# Altium schematic symbol library jlcpcb_2025_04_resistors_extended_0201.schlib: 1508 symbols (part 7 of 8) (continued)
## RTT01435JTH
designator R?  Resistance: 4.3MΩ  (hidden comment: *)
Resistor, 4.3MΩ, ±5%, 50mW, 25V, ±200ppm/℃, -55℃~+125℃, SMD 0201; Manufacturer: Uniroyal; Manufacturer Part Number: RTT01435JTH; Supplier 1: LCSC; Supplier Part Number 1: C166401; JLCPCB Part Number: C166401; Power Rating: 50mW; Category: Resistors; Package Size: 0201; JLCPCB Basic Part: Yes; Tolerance: ±5%; Voltage Rating: 25V; Temperature Coefficient: ±200ppm/℃; Temperature Rating: -55℃~+125℃; ComponentLink1Description: Datasheet; ComponentLink1URL: https://wmsc.lcsc.com/wmsc/upload/file/pdf/v2/lcsc/2304140030_RALEC-RTT01435JTH_C166401.pdf; ComponentLink2Description: JLCPCB Part URL; ComponentLink2URL: https://jlcpcb.com/partdetail/C166401
pins: 1, 2
1 alternate drawing of the same symbol

## RTT01510JTH
designator R?  Resistance: 51Ω  (hidden comment: *)
Resistor, 51Ω, ±5%, 50mW, 25V, ±200ppm/℃, -55℃~+125℃, SMD 0201; Manufacturer: Uniroyal; Manufacturer Part Number: RTT01510JTH; Supplier 1: LCSC; Supplier Part Number 1: C102735; JLCPCB Part Number: C102735; Power Rating: 50mW; Category: Resistors; Package Size: 0201; JLCPCB Basic Part: Yes; Tolerance: ±5%; Voltage Rating: 25V; Temperature Coefficient: ±200ppm/℃; Temperature Rating: -55℃~+125℃; ComponentLink1Description: Datasheet; ComponentLink1URL: https://wmsc.lcsc.com/wmsc/upload/file/pdf/v2/lcsc/2304140030_RALEC-RTT01510JTH_C102735.pdf; ComponentLink2Description: JLCPCB Part URL; ComponentLink2URL: https://jlcpcb.com/partdetail/C102735
pins: 1, 2
1 alternate drawing of the same symbol

## RTT01512JTH
designator R?  Resistance: 5.1kΩ  (hidden comment: *)
Resistor, 5.1kΩ, ±5%, 50mW, ±200ppm/℃, SMD 0201; Manufacturer: Uniroyal; Manufacturer Part Number: RTT01512JTH; Supplier 1: LCSC; Supplier Part Number 1: C158467; JLCPCB Part Number: C158467; Power Rating: 50mW; Category: Resistors; Package Size: 0201; JLCPCB Basic Part: Yes; Tolerance: ±5%; Temperature Coefficient: ±200ppm/℃; ComponentLink1Description: Datasheet; ComponentLink1URL: https://wmsc.lcsc.com/wmsc/upload/file/pdf/v2/lcsc/2304140030_RALEC-RTT01512JTH_C158467.pdf; ComponentLink2Description: JLCPCB Part URL; ComponentLink2URL: https://jlcpcb.com/partdetail/C158467
pins: 1, 2
1 alternate drawing of the same symbol

## RTT01513JTH
designator R?  Resistance: 51kΩ  (hidden comment: *)
Resistor, 51kΩ, ±5%, 50mW, ±200ppm/℃, SMD 0201; Manufacturer: Uniroyal; Manufacturer Part Number: RTT01513JTH; Supplier 1: LCSC; Supplier Part Number 1: C102736; JLCPCB Part Number: C102736; Power Rating: 50mW; Category: Resistors; Package Size: 0201; JLCPCB Basic Part: Yes; Tolerance: ±5%; Temperature Coefficient: ±200ppm/℃; ComponentLink1Description: Datasheet; ComponentLink1URL: https://wmsc.lcsc.com/wmsc/upload/file/pdf/v2/lcsc/2304140030_RALEC-RTT01513JTH_C102736.pdf; ComponentLink2Description: JLCPCB Part URL; ComponentLink2URL: https://jlcpcb.com/partdetail/C102736
pins: 1, 2
1 alternate drawing of the same symbol

## RTT01620JTH
designator R?  Resistance: 62Ω  (hidden comment: *)
Resistor, 62Ω, ±5%, 50mW, 25V, ±200ppm/℃, -55℃~+125℃, SMD 0201; Manufacturer: Uniroyal; Manufacturer Part Number: RTT01620JTH; Supplier 1: LCSC; Supplier Part Number 1: C166397; JLCPCB Part Number: C166397; Power Rating: 50mW; Category: Resistors; Package Size: 0201; JLCPCB Basic Part: Yes; Tolerance: ±5%; Voltage Rating: 25V; Temperature Coefficient: ±200ppm/℃; Temperature Rating: -55℃~+125℃; ComponentLink1Description: Datasheet; ComponentLink1URL: https://wmsc.lcsc.com/wmsc/upload/file/pdf/v2/lcsc/2304140030_RALEC-RTT01620JTH_C166397.pdf; ComponentLink2Description: JLCPCB Part URL; ComponentLink2URL: https://jlcpcb.com/partdetail/C166397
pins: 1, 2
1 alternate drawing of the same symbol

## RTT01680JTH
designator R?  Resistance: 68Ω  (hidden comment: *)
Resistor, 68Ω, ±5%, 50mW, 25V, ±200ppm/℃, -55℃~+125℃, SMD 0201; Manufacturer: Uniroyal; Manufacturer Part Number: RTT01680JTH; Supplier 1: LCSC; Supplier Part Number 1: C158386; JLCPCB Part Number: C158386; Power Rating: 50mW; Category: Resistors; Package Size: 0201; JLCPCB Basic Part: Yes; Tolerance: ±5%; Voltage Rating: 25V; Temperature Coefficient: ±200ppm/℃; Temperature Rating: -55℃~+125℃; ComponentLink1Description: Datasheet; ComponentLink1URL: https://wmsc.lcsc.com/wmsc/upload/file/pdf/v2/lcsc/2304140030_RALEC-RTT01680JTH_C158386.pdf; ComponentLink2Description: JLCPCB Part URL; ComponentLink2URL: https://jlcpcb.com/partdetail/C158386
pins: 1, 2
1 alternate drawing of the same symbol

## RTT01681JTH
designator R?  Resistance: 680Ω  (hidden comment: *)
Resistor, 680Ω, ±5%, 50mW, ±200ppm/℃, SMD 0201; Manufacturer: Uniroyal; Manufacturer Part Number: RTT01681JTH; Supplier 1: LCSC; Supplier Part Number 1: C158380; JLCPCB Part Number: C158380; Power Rating: 50mW; Category: Resistors; Package Size: 0201; JLCPCB Basic Part: Yes; Tolerance: ±5%; Temperature Coefficient: ±200ppm/℃; ComponentLink1Description: Datasheet; ComponentLink1URL: https://wmsc.lcsc.com/wmsc/upload/file/pdf/v2/lcsc/2304140030_RALEC-RTT01681JTH_C158380.pdf; ComponentLink2Description: JLCPCB Part URL; ComponentLink2URL: https://jlcpcb.com/partdetail/C158380
pins: 1, 2
1 alternate drawing of the same symbol

## RTT01683JTH
designator R?  Resistance: 68kΩ  (hidden comment: *)
Resistor, 68kΩ, ±5%, 50mW, 25V, ±200ppm/℃, -55℃~+125℃, SMD 0201; Manufacturer: Uniroyal; Manufacturer Part Number: RTT01683JTH; Supplier 1: LCSC; Supplier Part Number 1: C158378; JLCPCB Part Number: C158378; Power Rating: 50mW; Category: Resistors; Package Size: 0201; JLCPCB Basic Part: Yes; Tolerance: ±5%; Voltage Rating: 25V; Temperature Coefficient: ±200ppm/℃; Temperature Rating: -55℃~+125℃; ComponentLink1Description: Datasheet; ComponentLink1URL: https://wmsc.lcsc.com/wmsc/upload/file/pdf/v2/lcsc/2304140030_RALEC-RTT01683JTH_C158378.pdf; ComponentLink2Description: JLCPCB Part URL; ComponentLink2URL: https://jlcpcb.com/partdetail/C158378
pins: 1, 2
1 alternate drawing of the same symbol

## RTT01685JTH
designator R?  Resistance: 6.8MΩ  (hidden comment: *)
Resistor, 6.8MΩ, ±5%, 50mW, ±200ppm/℃, SMD 0201; Manufacturer: Uniroyal; Manufacturer Part Number: RTT01685JTH; Supplier 1: LCSC; Supplier Part Number 1: C158374; JLCPCB Part Number: C158374; Power Rating: 50mW; Category: Resistors; Package Size: 0201; JLCPCB Basic Part: Yes; Tolerance: ±5%; Temperature Coefficient: ±200ppm/℃; ComponentLink1Description: Datasheet; ComponentLink1URL: https://wmsc.lcsc.com/wmsc/upload/file/pdf/v2/lcsc/2304140030_RALEC-RTT01685JTH_C158374.pdf; ComponentLink2Description: JLCPCB Part URL; ComponentLink2URL: https://jlcpcb.com/partdetail/C158374
pins: 1, 2
1 alternate drawing of the same symbol

## RTT01754JTH
designator R?  Resistance: 750kΩ  (hidden comment: *)
Resistor, 750kΩ, ±5%, 50mW, 25V, ±200ppm/℃, -55℃~+125℃, SMD 0201; Manufacturer: Uniroyal; Manufacturer Part Number: RTT01754JTH; Supplier 1: LCSC; Supplier Part Number 1: C158350; JLCPCB Part Number: C158350; Power Rating: 50mW; Category: Resistors; Package Size: 0201; JLCPCB Basic Part: Yes; Tolerance: ±5%; Voltage Rating: 25V; Temperature Coefficient: ±200ppm/℃; Temperature Rating: -55℃~+125℃; ComponentLink1Description: Datasheet; ComponentLink1URL: https://wmsc.lcsc.com/wmsc/upload/file/pdf/v2/lcsc/2304140030_RALEC-RTT01754JTH_C158350.pdf; ComponentLink2Description: JLCPCB Part URL; ComponentLink2URL: https://jlcpcb.com/partdetail/C158350
pins: 1, 2
1 alternate drawing of the same symbol

## RTT01823JTH
designator R?  Resistance: 82kΩ  (hidden comment: *)
Resistor, 82kΩ, ±5%, 50mW, 25V, ±200ppm/℃, -55℃~+125℃, SMD 0201; Manufacturer: Uniroyal; Manufacturer Part Number: RTT01823JTH; Supplier 1: LCSC; Supplier Part Number 1: C166392; JLCPCB Part Number: C166392; Power Rating: 50mW; Category: Resistors; Package Size: 0201; JLCPCB Basic Part: Yes; Tolerance: ±5%; Voltage Rating: 25V; Temperature Coefficient: ±200ppm/℃; Temperature Rating: -55℃~+125℃; ComponentLink1Description: Datasheet; ComponentLink1URL: https://wmsc.lcsc.com/wmsc/upload/file/pdf/v2/lcsc/2304140030_RALEC-RTT01823JTH_C166392.pdf; ComponentLink2Description: JLCPCB Part URL; ComponentLink2URL: https://jlcpcb.com/partdetail/C166392
pins: 1, 2
1 alternate drawing of the same symbol

## RTT011001FTH
designator R?  Resistance: 1kΩ  (hidden comment: *)
Resistor, 1kΩ, ±1%, 50mW, 25V, ±200ppm/℃, -55℃~+125℃, SMD 0201; Manufacturer: Uniroyal; Manufacturer Part Number: RTT011001FTH; Supplier 1: LCSC; Supplier Part Number 1: C102683; JLCPCB Part Number: C102683; Power Rating: 50mW; Category: Resistors; Package Size: 0201; JLCPCB Basic Part: Yes; Tolerance: ±1%; Voltage Rating: 25V; Temperature Coefficient: ±200ppm/℃; Temperature Rating: -55℃~+125℃; ComponentLink1Description: Datasheet; ComponentLink1URL: https://wmsc.lcsc.com/wmsc/upload/file/pdf/v2/lcsc/2304140030_RALEC-RTT011001FTH_C102683.pdf; ComponentLink2Description: JLCPCB Part URL; ComponentLink2URL: https://jlcpcb.com/partdetail/C102683
pins: 1, 2
1 alternate drawing of the same symbol

## RTT011002FTH
designator R?  Resistance: 10kΩ  (hidden comment: *)
Resistor, 10kΩ, ±1%, 50mW, 25V, ±200ppm/℃, -55℃~+125℃, SMD 0201; Manufacturer: Uniroyal; Manufacturer Part Number: RTT011002FTH; Supplier 1: LCSC; Supplier Part Number 1: C102684; JLCPCB Part Number: C102684; Power Rating: 50mW; Category: Resistors; Package Size: 0201; JLCPCB Basic Part: Yes; Tolerance: ±1%; Voltage Rating: 25V; Temperature Coefficient: ±200ppm/℃; Temperature Rating: -55℃~+125℃; ComponentLink1Description: Datasheet; ComponentLink1URL: https://wmsc.lcsc.com/wmsc/upload/file/pdf/v2/lcsc/2304140030_RALEC-RTT011002FTH_C102684.pdf; ComponentLink2Description: JLCPCB Part URL; ComponentLink2URL: https://jlcpcb.com/partdetail/C102684
pins: 1, 2
1 alternate drawing of the same symbol

## RTT011003FTH
designator R?  Resistance: 100kΩ  (hidden comment: *)
Resistor, 100kΩ, ±1%, 50mW, 25V, ±200ppm/℃, -55℃~+125℃, SMD 0201; Manufacturer: Uniroyal; Manufacturer Part Number: RTT011003FTH; Supplier 1: LCSC; Supplier Part Number 1: C102685; JLCPCB Part Number: C102685; Power Rating: 50mW; Category: Resistors; Package Size: 0201; JLCPCB Basic Part: Yes; Tolerance: ±1%; Voltage Rating: 25V; Temperature Coefficient: ±200ppm/℃; Temperature Rating: -55℃~+125℃; ComponentLink1Description: Datasheet; ComponentLink1URL: https://wmsc.lcsc.com/wmsc/upload/file/pdf/v2/lcsc/2304140030_RALEC-RTT011003FTH_C102685.pdf; ComponentLink2Description: JLCPCB Part URL; ComponentLink2URL: https://jlcpcb.com/partdetail/C102685
pins: 1, 2
1 alternate drawing of the same symbol

## RTT011004FTH
designator R?  Resistance: 1MΩ  (hidden comment: *)
Resistor, 1MΩ, ±1%, 50mW, 25V, ±200ppm/℃, -55℃~+125℃, SMD 0201; Manufacturer: Uniroyal; Manufacturer Part Number: RTT011004FTH; Supplier 1: LCSC; Supplier Part Number 1: C102686; JLCPCB Part Number: C102686; Power Rating: 50mW; Category: Resistors; Package Size: 0201; JLCPCB Basic Part: Yes; Tolerance: ±1%; Voltage Rating: 25V; Temperature Coefficient: ±200ppm/℃; Temperature Rating: -55℃~+125℃; ComponentLink1Description: Datasheet; ComponentLink1URL: https://wmsc.lcsc.com/wmsc/upload/file/pdf/v2/lcsc/2304140030_RALEC-RTT011004FTH_C102686.pdf; ComponentLink2Description: JLCPCB Part URL; ComponentLink2URL: https://jlcpcb.com/partdetail/C102686
pins: 1, 2
1 alternate drawing of the same symbol

## RTT011050FTH
designator R?  Resistance: 105Ω  (hidden comment: *)
Resistor, 105Ω, ±1%, 50mW, ±200ppm/℃, SMD 0201; Manufacturer: Uniroyal; Manufacturer Part Number: RTT011050FTH; Supplier 1: LCSC; Supplier Part Number 1: C158870; JLCPCB Part Number: C158870; Power Rating: 50mW; Category: Resistors; Package Size: 0201; JLCPCB Basic Part: Yes; Tolerance: ±1%; Temperature Coefficient: ±200ppm/℃; ComponentLink1Description: Datasheet; ComponentLink1URL: https://wmsc.lcsc.com/wmsc/upload/file/pdf/v2/lcsc/2304140030_RALEC-RTT011050FTH_C158870.pdf; ComponentLink2Description: JLCPCB Part URL; ComponentLink2URL: https://jlcpcb.com/partdetail/C158870
pins: 1, 2
1 alternate drawing of the same symbol

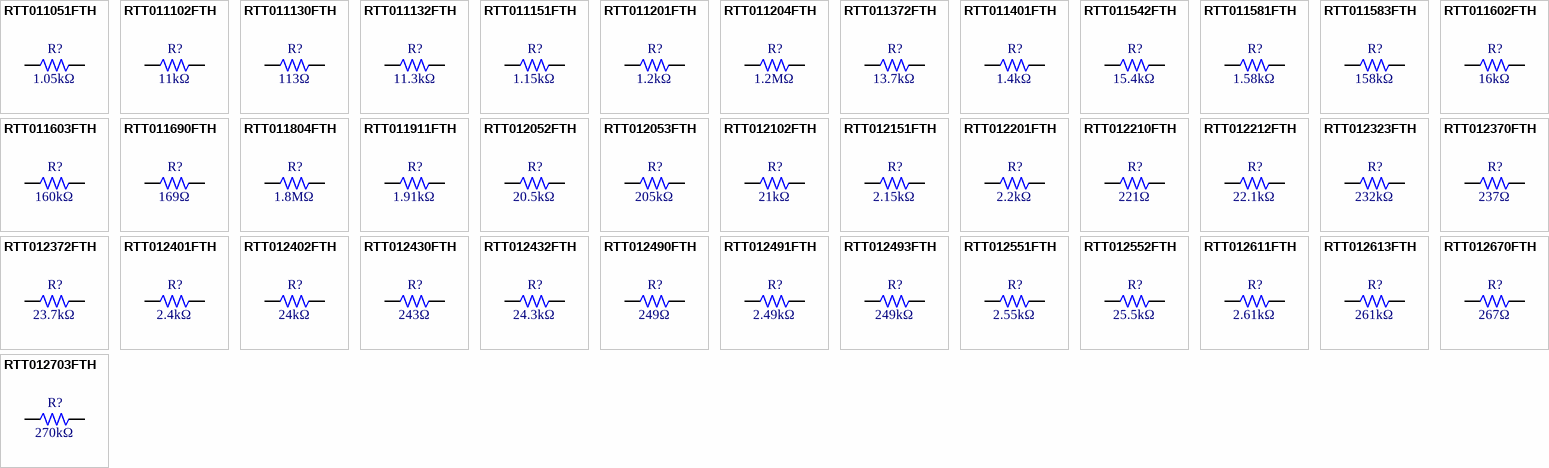
[diagram p31: symbols RTT011051FTH to RTT012703FTH]

## RTT011051FTH
designator R?  Resistance: 1.05kΩ  (hidden comment: *)
Resistor, 1.05kΩ, ±1%, 50mW, 25V, ±200ppm/℃, -55℃~+125℃, SMD 0201; Manufacturer: Uniroyal; Manufacturer Part Number: RTT011051FTH; Supplier 1: LCSC; Supplier Part Number 1: C332422; JLCPCB Part Number: C332422; Power Rating: 50mW; Category: Resistors; Package Size: 0201; JLCPCB Basic Part: Yes; Tolerance: ±1%; Voltage Rating: 25V; Temperature Coefficient: ±200ppm/℃; Temperature Rating: -55℃~+125℃; ComponentLink1Description: Datasheet; ComponentLink1URL: https://wmsc.lcsc.com/wmsc/upload/file/pdf/v2/lcsc/2304140030_RALEC-RTT011051FTH_C332422.pdf; ComponentLink2Description: JLCPCB Part URL; ComponentLink2URL: https://jlcpcb.com/partdetail/C332422
pins: 1, 2
1 alternate drawing of the same symbol

## RTT011102FTH
designator R?  Resistance: 11kΩ  (hidden comment: *)
Resistor, 11kΩ, ±1%, 50mW, 25V, ±200ppm/℃, -55℃~+125℃, SMD 0201; Manufacturer: Uniroyal; Manufacturer Part Number: RTT011102FTH; Supplier 1: LCSC; Supplier Part Number 1: C158863; JLCPCB Part Number: C158863; Power Rating: 50mW; Category: Resistors; Package Size: 0201; JLCPCB Basic Part: Yes; Tolerance: ±1%; Voltage Rating: 25V; Temperature Coefficient: ±200ppm/℃; Temperature Rating: -55℃~+125℃; ComponentLink1Description: Datasheet; ComponentLink1URL: https://wmsc.lcsc.com/wmsc/upload/file/pdf/v2/lcsc/2304140030_RALEC-RTT011102FTH_C158863.pdf; ComponentLink2Description: JLCPCB Part URL; ComponentLink2URL: https://jlcpcb.com/partdetail/C158863
pins: 1, 2
1 alternate drawing of the same symbol

## RTT011130FTH
designator R?  Resistance: 113Ω  (hidden comment: *)
Resistor, 113Ω, ±1%, 50mW, 25V, ±200ppm/℃, -55℃~+125℃, SMD 0201; Manufacturer: Uniroyal; Manufacturer Part Number: RTT011130FTH; Supplier 1: LCSC; Supplier Part Number 1: C158858; JLCPCB Part Number: C158858; Power Rating: 50mW; Category: Resistors; Package Size: 0201; JLCPCB Basic Part: Yes; Tolerance: ±1%; Voltage Rating: 25V; Temperature Coefficient: ±200ppm/℃; Temperature Rating: -55℃~+125℃; ComponentLink1Description: Datasheet; ComponentLink1URL: https://wmsc.lcsc.com/wmsc/upload/file/pdf/v2/lcsc/2304140030_RALEC-RTT011130FTH_C158858.pdf; ComponentLink2Description: JLCPCB Part URL; ComponentLink2URL: https://jlcpcb.com/partdetail/C158858
pins: 1, 2
1 alternate drawing of the same symbol

## RTT011132FTH
designator R?  Resistance: 11.3kΩ  (hidden comment: *)
Resistor, 11.3kΩ, ±1%, 50mW, 25V, ±200ppm/℃, -55℃~+125℃, SMD 0201; Manufacturer: Uniroyal; Manufacturer Part Number: RTT011132FTH; Supplier 1: LCSC; Supplier Part Number 1: C158857; JLCPCB Part Number: C158857; Power Rating: 50mW; Category: Resistors; Package Size: 0201; JLCPCB Basic Part: Yes; Tolerance: ±1%; Voltage Rating: 25V; Temperature Coefficient: ±200ppm/℃; Temperature Rating: -55℃~+125℃; ComponentLink1Description: Datasheet; ComponentLink1URL: https://wmsc.lcsc.com/wmsc/upload/file/pdf/v2/lcsc/2304140030_RALEC-RTT011132FTH_C158857.pdf; ComponentLink2Description: JLCPCB Part URL; ComponentLink2URL: https://jlcpcb.com/partdetail/C158857
pins: 1, 2
1 alternate drawing of the same symbol

## RTT011151FTH
designator R?  Resistance: 1.15kΩ  (hidden comment: *)
Resistor, 1.15kΩ, ±1%, 50mW, 25V, ±200ppm/℃, -55℃~+125℃, SMD 0201; Manufacturer: Uniroyal; Manufacturer Part Number: RTT011151FTH; Supplier 1: LCSC; Supplier Part Number 1: C158814; JLCPCB Part Number: C158814; Power Rating: 50mW; Category: Resistors; Package Size: 0201; JLCPCB Basic Part: Yes; Tolerance: ±1%; Voltage Rating: 25V; Temperature Coefficient: ±200ppm/℃; Temperature Rating: -55℃~+125℃; ComponentLink1Description: Datasheet; ComponentLink2Description: JLCPCB Part URL; ComponentLink2URL: https://jlcpcb.com/partdetail/C158814
pins: 1, 2
1 alternate drawing of the same symbol

## RTT011201FTH
designator R?  Resistance: 1.2kΩ  (hidden comment: *)
Resistor, 1.2kΩ, ±1%, 50mW, 25V, ±200ppm/℃, -55℃~+125℃, SMD 0201; Manufacturer: Uniroyal; Manufacturer Part Number: RTT011201FTH; Supplier 1: LCSC; Supplier Part Number 1: C102691; JLCPCB Part Number: C102691; Power Rating: 50mW; Category: Resistors; Package Size: 0201; JLCPCB Basic Part: Yes; Tolerance: ±1%; Voltage Rating: 25V; Temperature Coefficient: ±200ppm/℃; Temperature Rating: -55℃~+125℃; ComponentLink1Description: Datasheet; ComponentLink1URL: https://wmsc.lcsc.com/wmsc/upload/file/pdf/v2/lcsc/2304140030_RALEC-RTT011201FTH_C102691.pdf; ComponentLink2Description: JLCPCB Part URL; ComponentLink2URL: https://jlcpcb.com/partdetail/C102691
pins: 1, 2
1 alternate drawing of the same symbol

## RTT011204FTH
designator R?  Resistance: 1.2MΩ  (hidden comment: *)
Resistor, 1.2MΩ, ±1%, 50mW, 25V, ±200ppm/℃, -55℃~+125℃, SMD 0201; Manufacturer: Uniroyal; Manufacturer Part Number: RTT011204FTH; Supplier 1: LCSC; Supplier Part Number 1: C158842; JLCPCB Part Number: C158842; Power Rating: 50mW; Category: Resistors; Package Size: 0201; JLCPCB Basic Part: Yes; Tolerance: ±1%; Voltage Rating: 25V; Temperature Coefficient: ±200ppm/℃; Temperature Rating: -55℃~+125℃; ComponentLink1Description: Datasheet; ComponentLink1URL: https://wmsc.lcsc.com/wmsc/upload/file/pdf/v2/lcsc/2304140030_RALEC-RTT011204FTH_C158842.pdf; ComponentLink2Description: JLCPCB Part URL; ComponentLink2URL: https://jlcpcb.com/partdetail/C158842
pins: 1, 2
1 alternate drawing of the same symbol

## RTT011372FTH
designator R?  Resistance: 13.7kΩ  (hidden comment: *)
Resistor, 13.7kΩ, ±1%, 50mW, 25V, ±200ppm/℃, -55℃~+125℃, SMD 0201; Manufacturer: Uniroyal; Manufacturer Part Number: RTT011372FTH; Supplier 1: LCSC; Supplier Part Number 1: C158773; JLCPCB Part Number: C158773; Power Rating: 50mW; Category: Resistors; Package Size: 0201; JLCPCB Basic Part: Yes; Tolerance: ±1%; Voltage Rating: 25V; Temperature Coefficient: ±200ppm/℃; Temperature Rating: -55℃~+125℃; ComponentLink1Description: Datasheet; ComponentLink1URL: https://wmsc.lcsc.com/wmsc/upload/file/pdf/v2/lcsc/2304140030_RALEC-RTT011372FTH_C158773.pdf; ComponentLink2Description: JLCPCB Part URL; ComponentLink2URL: https://jlcpcb.com/partdetail/C158773
pins: 1, 2
1 alternate drawing of the same symbol

## RTT011401FTH
designator R?  Resistance: 1.4kΩ  (hidden comment: *)
Resistor, 1.4kΩ, ±1%, 50mW, 25V, ±200ppm/℃, -55℃~+125℃, SMD 0201; Manufacturer: Uniroyal; Manufacturer Part Number: RTT011401FTH; Supplier 1: LCSC; Supplier Part Number 1: C166352; JLCPCB Part Number: C166352; Power Rating: 50mW; Category: Resistors; Package Size: 0201; JLCPCB Basic Part: Yes; Tolerance: ±1%; Voltage Rating: 25V; Temperature Coefficient: ±200ppm/℃; Temperature Rating: -55℃~+125℃; ComponentLink1Description: Datasheet; ComponentLink1URL: https://wmsc.lcsc.com/wmsc/upload/file/pdf/v2/lcsc/2304140030_RALEC-RTT011401FTH_C166352.pdf; ComponentLink2Description: JLCPCB Part URL; ComponentLink2URL: https://jlcpcb.com/partdetail/C166352
pins: 1, 2
1 alternate drawing of the same symbol

## RTT011542FTH
designator R?  Resistance: 15.4kΩ  (hidden comment: *)
Resistor, 15.4kΩ, ±1%, 50mW, 25V, ±200ppm/℃, -55℃~+125℃, SMD 0201; Manufacturer: Uniroyal; Manufacturer Part Number: RTT011542FTH; Supplier 1: LCSC; Supplier Part Number 1: C166345; JLCPCB Part Number: C166345; Power Rating: 50mW; Category: Resistors; Package Size: 0201; JLCPCB Basic Part: Yes; Tolerance: ±1%; Voltage Rating: 25V; Temperature Coefficient: ±200ppm/℃; Temperature Rating: -55℃~+125℃; ComponentLink1Description: Datasheet; ComponentLink1URL: https://wmsc.lcsc.com/wmsc/upload/file/pdf/v2/lcsc/2304140030_RALEC-RTT011542FTH_C166345.pdf; ComponentLink2Description: JLCPCB Part URL; ComponentLink2URL: https://jlcpcb.com/partdetail/C166345
pins: 1, 2
1 alternate drawing of the same symbol

## RTT011581FTH
designator R?  Resistance: 1.58kΩ  (hidden comment: *)
Resistor, 1.58kΩ, ±1%, 50mW, 25V, ±200ppm/℃, -55℃~+125℃, SMD 0201; Manufacturer: Uniroyal; Manufacturer Part Number: RTT011581FTH; Supplier 1: LCSC; Supplier Part Number 1: C166343; JLCPCB Part Number: C166343; Power Rating: 50mW; Category: Resistors; Package Size: 0201; JLCPCB Basic Part: Yes; Tolerance: ±1%; Voltage Rating: 25V; Temperature Coefficient: ±200ppm/℃; Temperature Rating: -55℃~+125℃; ComponentLink1Description: Datasheet; ComponentLink1URL: https://wmsc.lcsc.com/wmsc/upload/file/pdf/v2/lcsc/2304140030_RALEC-RTT011581FTH_C166343.pdf; ComponentLink2Description: JLCPCB Part URL; ComponentLink2URL: https://jlcpcb.com/partdetail/C166343
pins: 1, 2
1 alternate drawing of the same symbol

## RTT011583FTH
designator R?  Resistance: 158kΩ  (hidden comment: *)
Resistor, 158kΩ, ±1%, 50mW, 25V, ±200ppm/℃, -55℃~+125℃, SMD 0201; Manufacturer: Uniroyal; Manufacturer Part Number: RTT011583FTH; Supplier 1: LCSC; Supplier Part Number 1: C166341; JLCPCB Part Number: C166341; Power Rating: 50mW; Category: Resistors; Package Size: 0201; JLCPCB Basic Part: Yes; Tolerance: ±1%; Voltage Rating: 25V; Temperature Coefficient: ±200ppm/℃; Temperature Rating: -55℃~+125℃; ComponentLink1Description: Datasheet; ComponentLink1URL: https://wmsc.lcsc.com/wmsc/upload/file/pdf/v2/lcsc/2304140030_RALEC-RTT011583FTH_C166341.pdf; ComponentLink2Description: JLCPCB Part URL; ComponentLink2URL: https://jlcpcb.com/partdetail/C166341
pins: 1, 2
1 alternate drawing of the same symbol

## RTT011602FTH
designator R?  Resistance: 16kΩ  (hidden comment: *)
Resistor, 16kΩ, ±1%, 50mW, 25V, ±200ppm/℃, -55℃~+125℃, SMD 0201; Manufacturer: Uniroyal; Manufacturer Part Number: RTT011602FTH; Supplier 1: LCSC; Supplier Part Number 1: C158778; JLCPCB Part Number: C158778; Power Rating: 50mW; Category: Resistors; Package Size: 0201; JLCPCB Basic Part: Yes; Tolerance: ±1%; Voltage Rating: 25V; Temperature Coefficient: ±200ppm/℃; Temperature Rating: -55℃~+125℃; ComponentLink1Description: Datasheet; ComponentLink1URL: https://wmsc.lcsc.com/wmsc/upload/file/pdf/v2/lcsc/2304140030_RALEC-RTT011602FTH_C158778.pdf; ComponentLink2Description: JLCPCB Part URL; ComponentLink2URL: https://jlcpcb.com/partdetail/C158778
pins: 1, 2
1 alternate drawing of the same symbol

## RTT011603FTH
designator R?  Resistance: 160kΩ  (hidden comment: *)
Resistor, 160kΩ, ±1%, 50mW, 25V, ±200ppm/℃, -55℃~+125℃, SMD 0201; Manufacturer: Uniroyal; Manufacturer Part Number: RTT011603FTH; Supplier 1: LCSC; Supplier Part Number 1: C158776; JLCPCB Part Number: C158776; Power Rating: 50mW; Category: Resistors; Package Size: 0201; JLCPCB Basic Part: Yes; Tolerance: ±1%; Voltage Rating: 25V; Temperature Coefficient: ±200ppm/℃; Temperature Rating: -55℃~+125℃; ComponentLink1Description: Datasheet; ComponentLink1URL: https://wmsc.lcsc.com/wmsc/upload/file/pdf/v2/lcsc/2304140030_RALEC-RTT011603FTH_C158776.pdf; ComponentLink2Description: JLCPCB Part URL; ComponentLink2URL: https://jlcpcb.com/partdetail/C158776
pins: 1, 2
1 alternate drawing of the same symbol

## RTT011690FTH
designator R?  Resistance: 169Ω  (hidden comment: *)
Resistor, 169Ω, ±1%, 50mW, 25V, ±200ppm/℃, -55℃~+125℃, SMD 0201; Manufacturer: Uniroyal; Manufacturer Part Number: RTT011690FTH; Supplier 1: LCSC; Supplier Part Number 1: C332453; JLCPCB Part Number: C332453; Power Rating: 50mW; Category: Resistors; Package Size: 0201; JLCPCB Basic Part: Yes; Tolerance: ±1%; Voltage Rating: 25V; Temperature Coefficient: ±200ppm/℃; Temperature Rating: -55℃~+125℃; ComponentLink1Description: Datasheet; ComponentLink1URL: https://wmsc.lcsc.com/wmsc/upload/file/pdf/v2/lcsc/2304140030_RALEC-RTT011690FTH_C332453.pdf; ComponentLink2Description: JLCPCB Part URL; ComponentLink2URL: https://jlcpcb.com/partdetail/C332453
pins: 1, 2
1 alternate drawing of the same symbol

## RTT011804FTH
designator R?  Resistance: 1.8MΩ  (hidden comment: *)
Resistor, 1.8MΩ, ±1%, 50mW, ±200ppm/℃, SMD 0201; Manufacturer: Uniroyal; Manufacturer Part Number: RTT011804FTH; Supplier 1: LCSC; Supplier Part Number 1: C166320; JLCPCB Part Number: C166320; Power Rating: 50mW; Category: Resistors; Package Size: 0201; JLCPCB Basic Part: Yes; Tolerance: ±1%; Temperature Coefficient: ±200ppm/℃; ComponentLink1Description: Datasheet; ComponentLink1URL: https://wmsc.lcsc.com/wmsc/upload/file/pdf/v2/lcsc/2304140030_RALEC-RTT011804FTH_C166320.pdf; ComponentLink2Description: JLCPCB Part URL; ComponentLink2URL: https://jlcpcb.com/partdetail/C166320
pins: 1, 2
1 alternate drawing of the same symbol

## RTT011911FTH
designator R?  Resistance: 1.91kΩ  (hidden comment: *)
Resistor, 1.91kΩ, ±1%, 50mW, 25V, ±200ppm/℃, -55℃~+125℃, SMD 0201; Manufacturer: Uniroyal; Manufacturer Part Number: RTT011911FTH; Supplier 1: LCSC; Supplier Part Number 1: C166310; JLCPCB Part Number: C166310; Power Rating: 50mW; Category: Resistors; Package Size: 0201; JLCPCB Basic Part: Yes; Tolerance: ±1%; Voltage Rating: 25V; Temperature Coefficient: ±200ppm/℃; Temperature Rating: -55℃~+125℃; ComponentLink1Description: Datasheet; ComponentLink1URL: https://wmsc.lcsc.com/wmsc/upload/file/pdf/v2/lcsc/2304140030_RALEC-RTT011911FTH_C166310.pdf; ComponentLink2Description: JLCPCB Part URL; ComponentLink2URL: https://jlcpcb.com/partdetail/C166310
pins: 1, 2
1 alternate drawing of the same symbol

## RTT012052FTH
designator R?  Resistance: 20.5kΩ  (hidden comment: *)
Resistor, 20.5kΩ, ±1%, 50mW, 25V, ±200ppm/℃, -55℃~+125℃, SMD 0201; Manufacturer: Uniroyal; Manufacturer Part Number: RTT012052FTH; Supplier 1: LCSC; Supplier Part Number 1: C166301; JLCPCB Part Number: C166301; Power Rating: 50mW; Category: Resistors; Package Size: 0201; JLCPCB Basic Part: Yes; Tolerance: ±1%; Voltage Rating: 25V; Temperature Coefficient: ±200ppm/℃; Temperature Rating: -55℃~+125℃; ComponentLink1Description: Datasheet; ComponentLink1URL: https://wmsc.lcsc.com/wmsc/upload/file/pdf/v2/lcsc/2304140030_RALEC-RTT012052FTH_C166301.pdf; ComponentLink2Description: JLCPCB Part URL; ComponentLink2URL: https://jlcpcb.com/partdetail/C166301
pins: 1, 2
1 alternate drawing of the same symbol

## RTT012053FTH
designator R?  Resistance: 205kΩ  (hidden comment: *)
Resistor, 205kΩ, ±1%, 50mW, 25V, ±200ppm/℃, -55℃~+125℃, SMD 0201; Manufacturer: Uniroyal; Manufacturer Part Number: RTT012053FTH; Supplier 1: LCSC; Supplier Part Number 1: C166300; JLCPCB Part Number: C166300; Power Rating: 50mW; Category: Resistors; Package Size: 0201; JLCPCB Basic Part: Yes; Tolerance: ±1%; Voltage Rating: 25V; Temperature Coefficient: ±200ppm/℃; Temperature Rating: -55℃~+125℃; ComponentLink1Description: Datasheet; ComponentLink1URL: https://wmsc.lcsc.com/wmsc/upload/file/pdf/v2/lcsc/2304140030_RALEC-RTT012053FTH_C166300.pdf; ComponentLink2Description: JLCPCB Part URL; ComponentLink2URL: https://jlcpcb.com/partdetail/C166300
pins: 1, 2
1 alternate drawing of the same symbol

## RTT012102FTH
designator R?  Resistance: 21kΩ  (hidden comment: *)
Resistor, 21kΩ, ±1%, 50mW, 25V, ±200ppm/℃, -55℃~+125℃, SMD 0201; Manufacturer: Uniroyal; Manufacturer Part Number: RTT012102FTH; Supplier 1: LCSC; Supplier Part Number 1: C332466; JLCPCB Part Number: C332466; Power Rating: 50mW; Category: Resistors; Package Size: 0201; JLCPCB Basic Part: Yes; Tolerance: ±1%; Voltage Rating: 25V; Temperature Coefficient: ±200ppm/℃; Temperature Rating: -55℃~+125℃; ComponentLink1Description: Datasheet; ComponentLink1URL: https://wmsc.lcsc.com/wmsc/upload/file/pdf/v2/lcsc/2304140030_RALEC-RTT012102FTH_C332466.pdf; ComponentLink2Description: JLCPCB Part URL; ComponentLink2URL: https://jlcpcb.com/partdetail/C332466
pins: 1, 2
1 alternate drawing of the same symbol

## RTT012151FTH
designator R?  Resistance: 2.15kΩ  (hidden comment: *)
Resistor, 2.15kΩ, ±1%, 50mW, 25V, ±200ppm/℃, -55℃~+125℃, SMD 0201; Manufacturer: Uniroyal; Manufacturer Part Number: RTT012151FTH; Supplier 1: LCSC; Supplier Part Number 1: C166296; JLCPCB Part Number: C166296; Power Rating: 50mW; Category: Resistors; Package Size: 0201; JLCPCB Basic Part: Yes; Tolerance: ±1%; Voltage Rating: 25V; Temperature Coefficient: ±200ppm/℃; Temperature Rating: -55℃~+125℃; ComponentLink1Description: Datasheet; ComponentLink1URL: https://wmsc.lcsc.com/wmsc/upload/file/pdf/v2/lcsc/2304140030_RALEC-RTT012151FTH_C166296.pdf; ComponentLink2Description: JLCPCB Part URL; ComponentLink2URL: https://jlcpcb.com/partdetail/C166296
pins: 1, 2
1 alternate drawing of the same symbol

## RTT012201FTH
designator R?  Resistance: 2.2kΩ  (hidden comment: *)
Resistor, 2.2kΩ, ±1%, 50mW, 25V, ±200ppm/℃, -55℃~+125℃, SMD 0201; Manufacturer: Uniroyal; Manufacturer Part Number: RTT012201FTH; Supplier 1: LCSC; Supplier Part Number 1: C158711; JLCPCB Part Number: C158711; Power Rating: 50mW; Category: Resistors; Package Size: 0201; JLCPCB Basic Part: Yes; Tolerance: ±1%; Voltage Rating: 25V; Temperature Coefficient: ±200ppm/℃; Temperature Rating: -55℃~+125℃; ComponentLink1Description: Datasheet; ComponentLink1URL: https://wmsc.lcsc.com/wmsc/upload/file/pdf/v2/lcsc/2304140030_RALEC-RTT012201FTH_C158711.pdf; ComponentLink2Description: JLCPCB Part URL; ComponentLink2URL: https://jlcpcb.com/partdetail/C158711
pins: 1, 2
1 alternate drawing of the same symbol

## RTT012210FTH
designator R?  Resistance: 221Ω  (hidden comment: *)
Resistor, 221Ω, ±1%, 50mW, 25V, ±200ppm/℃, -55℃~+125℃, SMD 0201; Manufacturer: Uniroyal; Manufacturer Part Number: RTT012210FTH; Supplier 1: LCSC; Supplier Part Number 1: C166293; JLCPCB Part Number: C166293; Power Rating: 50mW; Category: Resistors; Package Size: 0201; JLCPCB Basic Part: Yes; Tolerance: ±1%; Voltage Rating: 25V; Temperature Coefficient: ±200ppm/℃; Temperature Rating: -55℃~+125℃; ComponentLink1Description: Datasheet; ComponentLink1URL: https://wmsc.lcsc.com/wmsc/upload/file/pdf/v2/lcsc/2304140030_RALEC-RTT012210FTH_C166293.pdf; ComponentLink2Description: JLCPCB Part URL; ComponentLink2URL: https://jlcpcb.com/partdetail/C166293
pins: 1, 2
1 alternate drawing of the same symbol

## RTT012212FTH
designator R?  Resistance: 22.1kΩ  (hidden comment: *)
Resistor, 22.1kΩ, ±1%, 50mW, 25V, ±200ppm/℃, -55℃~+125℃, SMD 0201; Manufacturer: Uniroyal; Manufacturer Part Number: RTT012212FTH; Supplier 1: LCSC; Supplier Part Number 1: C158703; JLCPCB Part Number: C158703; Power Rating: 50mW; Category: Resistors; Package Size: 0201; JLCPCB Basic Part: Yes; Tolerance: ±1%; Voltage Rating: 25V; Temperature Coefficient: ±200ppm/℃; Temperature Rating: -55℃~+125℃; ComponentLink1Description: Datasheet; ComponentLink1URL: https://wmsc.lcsc.com/wmsc/upload/file/pdf/v2/lcsc/2304140030_RALEC-RTT012212FTH_C158703.pdf; ComponentLink2Description: JLCPCB Part URL; ComponentLink2URL: https://jlcpcb.com/partdetail/C158703
pins: 1, 2
1 alternate drawing of the same symbol

## RTT012323FTH
designator R?  Resistance: 232kΩ  (hidden comment: *)
Resistor, 232kΩ, ±1%, 50mW, 25V, ±200ppm/℃, -55℃~+125℃, SMD 0201; Manufacturer: Uniroyal; Manufacturer Part Number: RTT012323FTH; Supplier 1: LCSC; Supplier Part Number 1: C166288; JLCPCB Part Number: C166288; Power Rating: 50mW; Category: Resistors; Package Size: 0201; JLCPCB Basic Part: Yes; Tolerance: ±1%; Voltage Rating: 25V; Temperature Coefficient: ±200ppm/℃; Temperature Rating: -55℃~+125℃; ComponentLink1Description: Datasheet; ComponentLink1URL: https://wmsc.lcsc.com/wmsc/upload/file/pdf/v2/lcsc/2304140030_RALEC-RTT012323FTH_C166288.pdf; ComponentLink2Description: JLCPCB Part URL; ComponentLink2URL: https://jlcpcb.com/partdetail/C166288
pins: 1, 2
1 alternate drawing of the same symbol

## RTT012370FTH
designator R?  Resistance: 237Ω  (hidden comment: *)
Resistor, 237Ω, ±1%, 50mW, 25V, ±200ppm/℃, -55℃~+125℃, SMD 0201; Manufacturer: Uniroyal; Manufacturer Part Number: RTT012370FTH; Supplier 1: LCSC; Supplier Part Number 1: C166287; JLCPCB Part Number: C166287; Power Rating: 50mW; Category: Resistors; Package Size: 0201; JLCPCB Basic Part: Yes; Tolerance: ±1%; Voltage Rating: 25V; Temperature Coefficient: ±200ppm/℃; Temperature Rating: -55℃~+125℃; ComponentLink1Description: Datasheet; ComponentLink1URL: https://wmsc.lcsc.com/wmsc/upload/file/pdf/v2/lcsc/2304140030_RALEC-RTT012370FTH_C166287.pdf; ComponentLink2Description: JLCPCB Part URL; ComponentLink2URL: https://jlcpcb.com/partdetail/C166287
pins: 1, 2
1 alternate drawing of the same symbol

## RTT012372FTH
designator R?  Resistance: 23.7kΩ  (hidden comment: *)
Resistor, 23.7kΩ, ±1%, 50mW, 25V, ±200ppm/℃, -55℃~+125℃, SMD 0201; Manufacturer: Uniroyal; Manufacturer Part Number: RTT012372FTH; Supplier 1: LCSC; Supplier Part Number 1: C166285; JLCPCB Part Number: C166285; Power Rating: 50mW; Category: Resistors; Package Size: 0201; JLCPCB Basic Part: Yes; Tolerance: ±1%; Voltage Rating: 25V; Temperature Coefficient: ±200ppm/℃; Temperature Rating: -55℃~+125℃; ComponentLink1Description: Datasheet; ComponentLink1URL: https://wmsc.lcsc.com/wmsc/upload/file/pdf/v2/lcsc/2304140030_RALEC-RTT012372FTH_C166285.pdf; ComponentLink2Description: JLCPCB Part URL; ComponentLink2URL: https://jlcpcb.com/partdetail/C166285
pins: 1, 2
1 alternate drawing of the same symbol

## RTT012401FTH
designator R?  Resistance: 2.4kΩ  (hidden comment: *)
Resistor, 2.4kΩ, ±1%, 50mW, ±200ppm/℃, SMD 0201; Manufacturer: Uniroyal; Manufacturer Part Number: RTT012401FTH; Supplier 1: LCSC; Supplier Part Number 1: C166281; JLCPCB Part Number: C166281; Power Rating: 50mW; Category: Resistors; Package Size: 0201; JLCPCB Basic Part: Yes; Tolerance: ±1%; Temperature Coefficient: ±200ppm/℃; ComponentLink1Description: Datasheet; ComponentLink1URL: https://wmsc.lcsc.com/wmsc/upload/file/pdf/v2/lcsc/2304140030_RALEC-RTT012401FTH_C166281.pdf; ComponentLink2Description: JLCPCB Part URL; ComponentLink2URL: https://jlcpcb.com/partdetail/C166281
pins: 1, 2
1 alternate drawing of the same symbol

## RTT012402FTH
designator R?  Resistance: 24kΩ  (hidden comment: *)
Resistor, 24kΩ, ±1%, 50mW, 25V, ±200ppm/℃, -55℃~+125℃, SMD 0201; Manufacturer: Uniroyal; Manufacturer Part Number: RTT012402FTH; Supplier 1: LCSC; Supplier Part Number 1: C158685; JLCPCB Part Number: C158685; Power Rating: 50mW; Category: Resistors; Package Size: 0201; JLCPCB Basic Part: Yes; Tolerance: ±1%; Voltage Rating: 25V; Temperature Coefficient: ±200ppm/℃; Temperature Rating: -55℃~+125℃; ComponentLink1Description: Datasheet; ComponentLink1URL: https://wmsc.lcsc.com/wmsc/upload/file/pdf/v2/lcsc/2304140030_RALEC-RTT012402FTH_C158685.pdf; ComponentLink2Description: JLCPCB Part URL; ComponentLink2URL: https://jlcpcb.com/partdetail/C158685
pins: 1, 2
1 alternate drawing of the same symbol

## RTT012430FTH
designator R?  Resistance: 243Ω  (hidden comment: *)
Resistor, 243Ω, ±1%, 50mW, ±200ppm/℃, SMD 0201; Manufacturer: Uniroyal; Manufacturer Part Number: RTT012430FTH; Supplier 1: LCSC; Supplier Part Number 1: C166280; JLCPCB Part Number: C166280; Power Rating: 50mW; Category: Resistors; Package Size: 0201; JLCPCB Basic Part: Yes; Tolerance: ±1%; Temperature Coefficient: ±200ppm/℃; ComponentLink1Description: Datasheet; ComponentLink1URL: https://wmsc.lcsc.com/wmsc/upload/file/pdf/v2/lcsc/2304140030_RALEC-RTT012430FTH_C166280.pdf; ComponentLink2Description: JLCPCB Part URL; ComponentLink2URL: https://jlcpcb.com/partdetail/C166280
pins: 1, 2
1 alternate drawing of the same symbol

## RTT012432FTH
designator R?  Resistance: 24.3kΩ  (hidden comment: *)
Resistor, 24.3kΩ, ±1%, 50mW, 25V, ±200ppm/℃, -55℃~+125℃, SMD 0201; Manufacturer: Uniroyal; Manufacturer Part Number: RTT012432FTH; Supplier 1: LCSC; Supplier Part Number 1: C166279; JLCPCB Part Number: C166279; Power Rating: 50mW; Category: Resistors; Package Size: 0201; JLCPCB Basic Part: Yes; Tolerance: ±1%; Voltage Rating: 25V; Temperature Coefficient: ±200ppm/℃; Temperature Rating: -55℃~+125℃; ComponentLink1Description: Datasheet; ComponentLink1URL: https://wmsc.lcsc.com/wmsc/upload/file/pdf/v2/lcsc/2304140030_RALEC-RTT012432FTH_C166279.pdf; ComponentLink2Description: JLCPCB Part URL; ComponentLink2URL: https://jlcpcb.com/partdetail/C166279
pins: 1, 2
1 alternate drawing of the same symbol

## RTT012490FTH
designator R?  Resistance: 249Ω  (hidden comment: *)
Resistor, 249Ω, ±1%, 50mW, 25V, ±200ppm/℃, -55℃~+125℃, SMD 0201; Manufacturer: Uniroyal; Manufacturer Part Number: RTT012490FTH; Supplier 1: LCSC; Supplier Part Number 1: C166277; JLCPCB Part Number: C166277; Power Rating: 50mW; Category: Resistors; Package Size: 0201; JLCPCB Basic Part: Yes; Tolerance: ±1%; Voltage Rating: 25V; Temperature Coefficient: ±200ppm/℃; Temperature Rating: -55℃~+125℃; ComponentLink1Description: Datasheet; ComponentLink1URL: https://wmsc.lcsc.com/wmsc/upload/file/pdf/v2/lcsc/2304140030_RALEC-RTT012490FTH_C166277.pdf; ComponentLink2Description: JLCPCB Part URL; ComponentLink2URL: https://jlcpcb.com/partdetail/C166277
pins: 1, 2
1 alternate drawing of the same symbol

## RTT012491FTH
designator R?  Resistance: 2.49kΩ  (hidden comment: *)
Resistor, 2.49kΩ, ±1%, 50mW, 25V, ±200ppm/℃, -55℃~+125℃, SMD 0201; Manufacturer: Uniroyal; Manufacturer Part Number: RTT012491FTH; Supplier 1: LCSC; Supplier Part Number 1: C158640; JLCPCB Part Number: C158640; Power Rating: 50mW; Category: Resistors; Package Size: 0201; JLCPCB Basic Part: Yes; Tolerance: ±1%; Voltage Rating: 25V; Temperature Coefficient: ±200ppm/℃; Temperature Rating: -55℃~+125℃; ComponentLink1Description: Datasheet; ComponentLink2Description: JLCPCB Part URL; ComponentLink2URL: https://jlcpcb.com/partdetail/C158640
pins: 1, 2
1 alternate drawing of the same symbol

## RTT012493FTH
designator R?  Resistance: 249kΩ  (hidden comment: *)
Resistor, 249kΩ, ±1%, 50mW, 25V, ±200ppm/℃, -55℃~+125℃, SMD 0201; Manufacturer: Uniroyal; Manufacturer Part Number: RTT012493FTH; Supplier 1: LCSC; Supplier Part Number 1: C166276; JLCPCB Part Number: C166276; Power Rating: 50mW; Category: Resistors; Package Size: 0201; JLCPCB Basic Part: Yes; Tolerance: ±1%; Voltage Rating: 25V; Temperature Coefficient: ±200ppm/℃; Temperature Rating: -55℃~+125℃; ComponentLink1Description: Datasheet; ComponentLink1URL: https://wmsc.lcsc.com/wmsc/upload/file/pdf/v2/lcsc/2304140030_RALEC-RTT012493FTH_C166276.pdf; ComponentLink2Description: JLCPCB Part URL; ComponentLink2URL: https://jlcpcb.com/partdetail/C166276
pins: 1, 2
1 alternate drawing of the same symbol

## RTT012551FTH
designator R?  Resistance: 2.55kΩ  (hidden comment: *)
Resistor, 2.55kΩ, ±1%, 50mW, 25V, ±200ppm/℃, -55℃~+125℃, SMD 0201; Manufacturer: Uniroyal; Manufacturer Part Number: RTT012551FTH; Supplier 1: LCSC; Supplier Part Number 1: C166274; JLCPCB Part Number: C166274; Power Rating: 50mW; Category: Resistors; Package Size: 0201; JLCPCB Basic Part: Yes; Tolerance: ±1%; Voltage Rating: 25V; Temperature Coefficient: ±200ppm/℃; Temperature Rating: -55℃~+125℃; ComponentLink1Description: Datasheet; ComponentLink1URL: https://wmsc.lcsc.com/wmsc/upload/file/pdf/v2/lcsc/2304140030_RALEC-RTT012551FTH_C166274.pdf; ComponentLink2Description: JLCPCB Part URL; ComponentLink2URL: https://jlcpcb.com/partdetail/C166274
pins: 1, 2
1 alternate drawing of the same symbol

## RTT012552FTH
designator R?  Resistance: 25.5kΩ  (hidden comment: *)
Resistor, 25.5kΩ, ±1%, 50mW, ±200ppm/℃, SMD 0201; Manufacturer: Uniroyal; Manufacturer Part Number: RTT012552FTH; Supplier 1: LCSC; Supplier Part Number 1: C158669; JLCPCB Part Number: C158669; Power Rating: 50mW; Category: Resistors; Package Size: 0201; JLCPCB Basic Part: Yes; Tolerance: ±1%; Temperature Coefficient: ±200ppm/℃; ComponentLink1Description: Datasheet; ComponentLink1URL: https://wmsc.lcsc.com/wmsc/upload/file/pdf/v2/lcsc/2304140030_RALEC-RTT012552FTH_C158669.pdf; ComponentLink2Description: JLCPCB Part URL; ComponentLink2URL: https://jlcpcb.com/partdetail/C158669
pins: 1, 2
1 alternate drawing of the same symbol
